# Altium footprint library laihi.PcbLib: 222 footprints (part 1 of 14)
Each footprint in its own frame and in the unit in brackets; x right, y up, seen from the top. Pads: shape width x height; smd on the part's side, far side on the other; paste and mask are expansions set on the pad; w line width, h text height; cw(c..) or ccw(c..) is an arc to the next point about the centre after c.
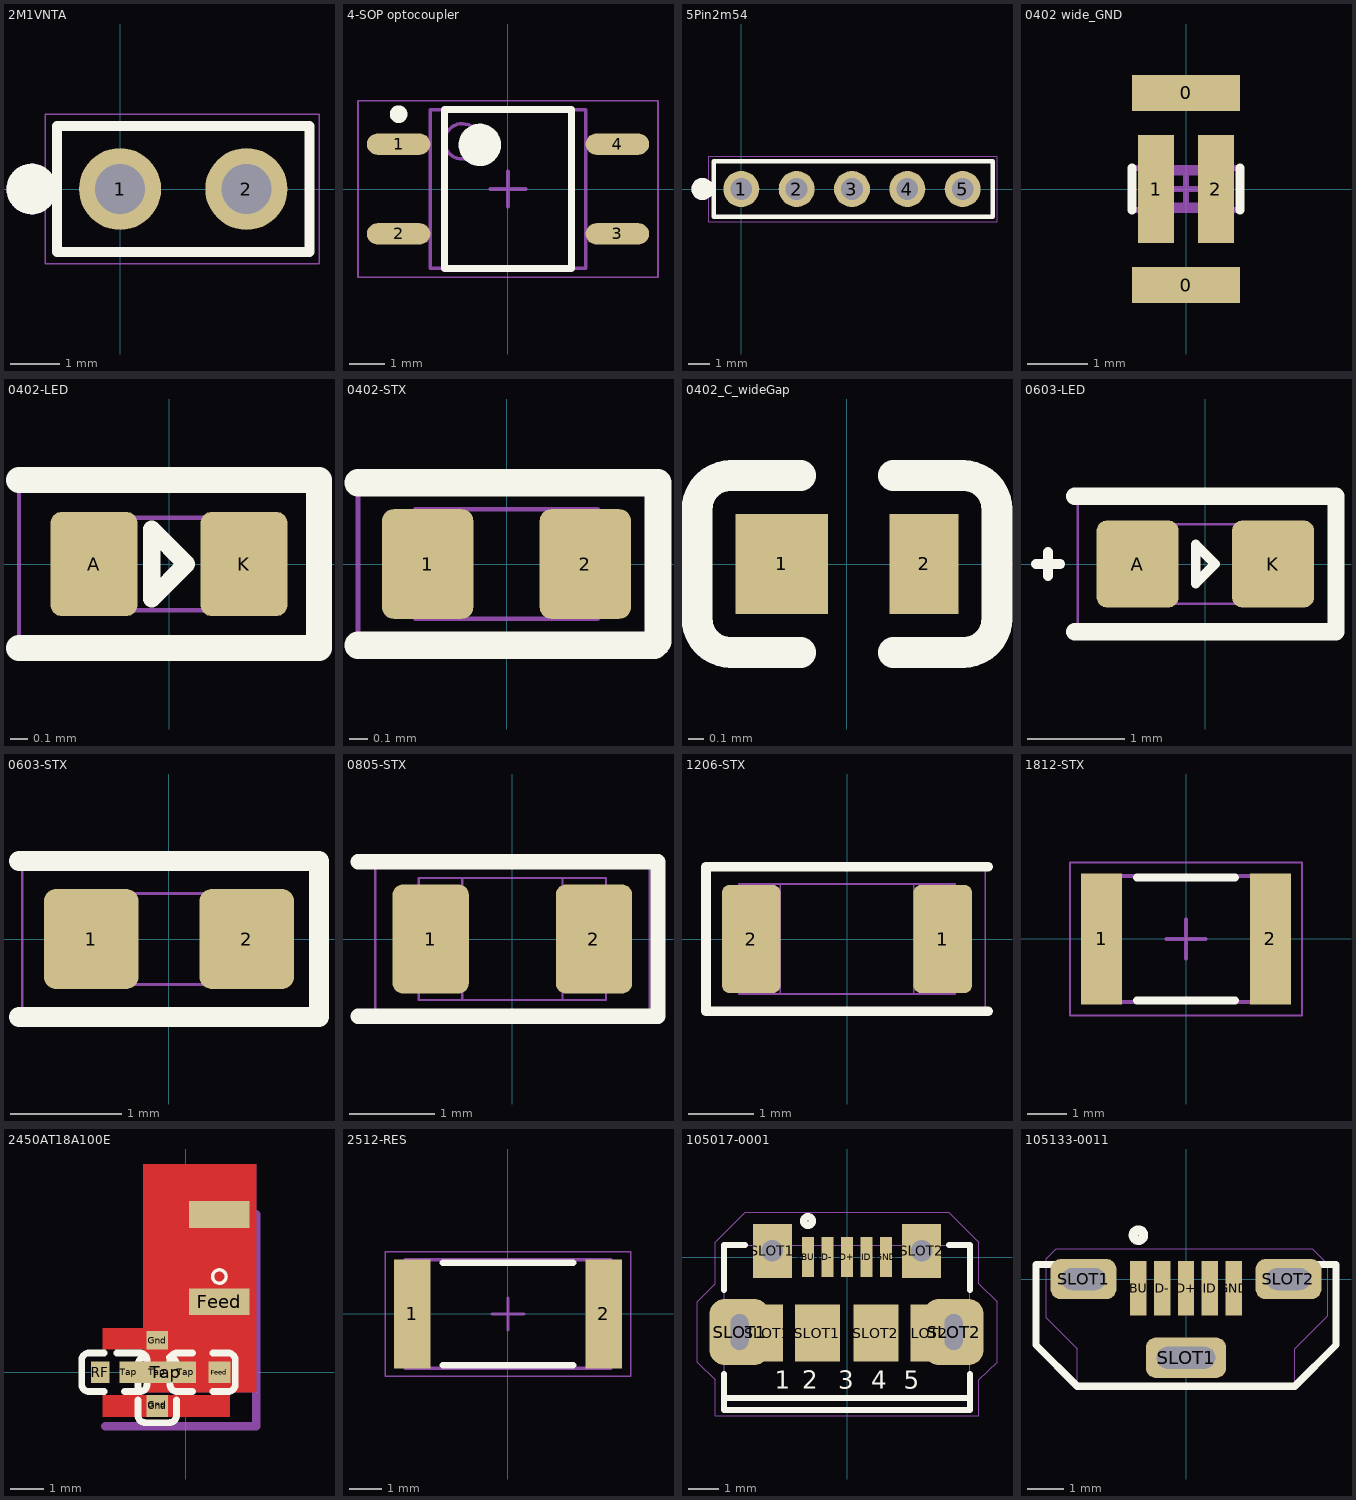
[diagram p0: the footprints below, top view; thin cyan lines are the x and y axes]

## 2M1VNTA [mil]
pads (2):
  round 65 / inner round 65 / far side rect 65x65 hole 39.37: 1(0,0)
  round 65 hole 39.37: 2(100,0)
Top Overlay:
  circle w20: c-70,0 r10
  lines w8: -50,-50 150,-50 150,50 -50,50 -50,-50
Mechanical 13:
  circle w20: c-70,0 r10
  circle w1: c0,0 r19.68
  circle w1: c100,0 r19.75
  lines w1: -50,-50 150,-50 150,50 -50,50 -50,-50 ; -10,-10 10,-10 10,10 -10,10 -10,-10 ; 90,-10 90,10 110,10 110,-10 90,-10
Mechanical 15:
  lines w1: -59.06,-59.06 -59.06,59.06 157.48,59.06 157.48,-59.06 -59.06,-59.06
3D body "header_male_2011GS_1x2pin_straight.stp": height 336.22, standoff -118.11, extent -50,-50 148.43,48.43

## 4-SOP optocoupler [mm] "NEC2711"
height 2.1
pads (4):
  oval 1.8x0.6 smd: 1(-3.1,1.27) 2(-3.1,-1.27) 3(3.1,-1.27) 4(3.1,1.27)
Top Overlay:
  circle w0.6: c-0.8,1.25 r0.3
  circle w0.25: c-3.1,2.12 r0.125
  lines w0.2: -1.8,-2.25 1.8,-2.25 1.8,2.25 -1.8,2.25 -1.8,-2.25
Mechanical 13:
  circle w0.1: c-1.3,1.35 r0.5
  lines w0.1: -2.2,-2.25 2.2,-2.25 2.2,2.25 -2.2,2.25 -2.2,-2.25
Mechanical 15:
  lines w0.05: -4.25,-2.5 4.25,-2.5 4.25,2.5 -4.25,2.5 -4.25,-2.5
  lines w0.1: -0.5,0 0.5,0 ; 0,-0.5 0,0.5
3D body "4-SOP optocoupler.step": height 2.1, standoff 0, extent -3.5,-2.25 3.5,2.25

## 5Pin2m54 [mil]
pads (5):
  round 65 / inner round 65 / far side rect 65x65 hole 39.37: 1(0,0)
  round 65 hole 39.37: 2(100,0) 3(200,0) 4(300,0) 5(400,0)
Top Overlay:
  circle w20: c-70,0 r10
  lines w8: -50,-50 454,-50 454,50 -50,50 -50,-50
Mechanical 13:
  circle w20: c-70,0 r10
  circle w1: c0,0 r19.68
  circle w1: c100,0 r19.75
  lines w1: -50,-50 454,-50 454,50 -50,50 -50,-50 ; -10,-10 10,-10 10,10 -10,10 -10,-10 ; 90,-10 90,10 110,10 110,-10 90,-10
Mechanical 15:
  lines w1: -59.06,-59.06 -59.06,59.06 462,59.06 462,-59.06 -59.06,-59.06

## 0402 wide_GND [mm] "Chip Capacitor, 2-Leads, Body 1.0x0.5mm, IPC High Density"
height 0.4
pads (4):
  rect 1.8x0.6 smd: 0(0,-1.6) 0(0,1.6)
  rect 0.6x1.8 smd: 1(-0.5,0) 2(0.5,0)
Top Overlay:
  lines w0.152: -0.9,-0.35 -0.9,0.35 ; 0.9,-0.35 0.9,0.35
Mechanical 13:
  lines w0.1: -0.525,-0.275 -0.525,0.275 0.525,0.275 0.525,-0.275 -0.525,-0.275
Mechanical 15:
  lines w0.1: -0.275,0 0.275,0 ; 0,-0.275 0,0.275 ; -0.9,-0.35 0.9,-0.35 0.9,0.35 -0.9,0.35 -0.9,-0.35
3D body "User Library-0402(1005M) Cap.step": height 0.5, standoff -0.01, extent -0.508,-0.254 0.508,0.254

## 0402-LED [mm]
height 0.406
pads (2):
  rrect25% 0.5x0.6 smd mask+0.127: A(-0.432,0) K(0.432,0)
Top Overlay:
  lines w0.102: -0.1,-0.2 0.1,0 -0.1,0.2 -0.1,-0.2
  lines w0.15: -0.864,-0.483 0.864,-0.483 0.864,0.483 -0.864,0.483
Mechanical 13:
  lines w0.025: -0.254,-0.267 -0.254,0.267 ; 0.254,-0.267 0.254,0.267 ; -0.533,-0.267 -0.533,0.267 0.546,0.267 0.546,-0.267 -0.533,-0.267
Mechanical 15:
  lines w0.025: -0.864,-0.483 -0.864,0.483 0.864,0.483 0.864,-0.483 -0.864,-0.483
3D body: height 0.56, standoff 0, extent -0.257,-0.282 0.258,0.284
3D body: height 0.55, standoff 0, extent -0.533,-0.267 0.546,0.267

## 0402-STX [mm]
height 0.406
pads (2):
  rrect25% 0.5x0.6 smd mask+0.051: 1(-0.432,0) 2(0.432,0)
Top Overlay:
  lines w0.15: -0.813,-0.445 0.809,-0.445 0.829,-0.424 0.829,0.445 -0.813,0.445
Mechanical 13:
  lines w0.025: -0.248,-0.3 -0.248,0.3 ; 0.26,-0.3 0.26,0.3 ; -0.5,-0.3 0.5,-0.3 0.5,0.3 -0.5,0.3 -0.5,-0.3
Mechanical 15:
  lines w0.025: -0.813,-0.445 0.813,-0.445 0.813,0.445 -0.813,0.445 -0.813,-0.445
3D body "0402-RES.stp": height 0.42, standoff 0, extent -0.5,-0.3 0.5,0.3

## 0402_C_wideGap [mm]
pads (2):
  rect 0.6x0.65 smd mask+0.051: 1(-0.425,0)
  rect 0.448x0.65 smd mask+0.051: 2(0.501,0)
Top Overlay:
  lines w0.2: -0.755,-0.575 cw(c-0.755,-0.355) -0.975,-0.355 -0.975,0.355 cw(c-0.755,0.355) -0.755,0.575 ; -0.75,-0.575 -0.3,-0.575 ; -0.75,0.575 -0.3,0.575 ; 0.3,-0.575 0.75,-0.575 ; 0.3,0.575 0.75,0.575 ; 0.755,-0.575 ccw(c0.755,-0.355) 0.975,-0.355 0.975,0.355 ccw(c0.755,0.355) 0.755,0.575
3D body "0402 SMD Capacitor.step": height 0.2, standoff 0, extent -0.483,-0.3 0.518,0.3

## 0603-LED [mm] "STX"
height 0.508
pads (2):
  rrect25% 0.85x0.9 smd mask+0.127: A(-0.7,0) K(0.7,0)
Top Overlay:
  lines w0.102: -1.75,0 -1.5,0 ; -1.625,-0.125 -1.625,0.125 ; -0.1,-0.2 -0.1,0.2 0.1,0 -0.1,-0.2
  lines w0.18: -1.35,-0.7 1.35,-0.7 1.35,0.7 -1.35,0.7
Mechanical 13:
  lines w0.025: -0.5,-0.41 -0.5,0.41 ; 0.5,-0.41 0.5,0.41 ; -0.85,-0.41 0.85,-0.41 0.85,0.41 -0.85,0.41 -0.85,-0.41
Mechanical 15:
  lines w0.025: -1.321,-0.648 -1.321,0.648 1.321,0.648 1.321,-0.648 -1.321,-0.648
3D body "0603-RES.stp": height 0.57, standoff 0, extent -0.9,-0.45 0.9,0.45

## 0603-STX [mm] "STX"
height 0.508
pads (2):
  rrect25% 0.85x0.9 smd mask+0.127: 1(-0.7,0) 2(0.7,0)
Top Overlay:
  lines w0.18: -1.35,-0.7 1.35,-0.7 1.35,0.7 -1.35,0.7
Mechanical 13:
  lines w0.025: -0.5,-0.41 -0.5,0.41 ; 0.5,-0.41 0.5,0.41 ; -0.85,-0.41 -0.85,0.41 0.85,0.41 0.85,-0.41 -0.85,-0.41
Mechanical 15:
  lines w0.025: -1.321,-0.648 1.321,-0.648 1.321,0.648 -1.321,0.648 -1.321,-0.648
3D body "0603-RES.stp": height 0.57, standoff 0, extent -0.9,-0.45 0.9,0.45

## 0805-STX [mil] "STX"
height 20
pads (2):
  rrect25% 35x50 smd mask+5: 1(-37.5,0) 2(37.5,0)
Top Overlay:
  lines w7.09: -70.9,-35.43 66.9,-35.43 66.9,35.43 -70.9,35.43
Mechanical 13:
  lines w1: -23,-28 -23,28 ; 23,-28 23,28 ; -43,-28 -43,28 43,28 43,-28 -43,-28
Mechanical 15:
  lines w0.98: -62.99,-33.46 -62.99,33.46 62.99,33.46 62.99,-33.46 -62.99,-33.46
3D body "0805-RES.stp": height 24.41, standoff 0, extent -43.3,-26.57 43.31,26.58

## 1206-STX [mil] "STX"
height 24.02
pads (2):
  rrect25% 35x65 smd mask+5: 1(57.48,0) 2(-57.48,0)
Top Overlay:
  lines w5.91: 84.65,-43.31 -84.65,-43.31 -84.65,43.31 84.65,43.31
Mechanical 13:
  lines w0.98: -65,-32.99 65,-32.99
  lines w1: -65,-33 -65,33 65,33 65,-33 ; -40,-33 -40,33 ; 40,-33 40,33
Mechanical 15:
  lines w1: -83,-43 -83,43 83,43 83,-43 -83,-43
3D body "1206-RES.stp": height 28.35, standoff 0, extent -66.93,-35.44 66.93,35.43

## 1812-STX [mm] "1812 (or 4532 metric)"
height 1.4
pads (2):
  rect 1.05x3.34 smd: 1(-2.15,0) 2(2.15,0)
Top Overlay:
  lines w0.2: -1.25,-1.57 1.25,-1.57 ; -1.25,1.57 1.25,1.57
Mechanical 13:
  lines w0.1: -2.25,-1.6 -2.25,1.6 2.25,1.6 2.25,-1.6 -2.25,-1.6
Mechanical 15:
  lines w0.05: -2.95,-1.95 -2.95,1.95 2.95,1.95 2.95,-1.95 -2.95,-1.95
  lines w0.1: -0.5,0 0.5,0 ; 0,-0.5 0,0.5
3D body: height 1.4, standoff 0, extent -1.74,-1.6 1.74,1.6
3D body: height 1.4, standoff 0, extent -2.25,-1.6 -1.74,1.6
3D body: height 1.4, standoff 0, extent 1.74,-1.6 2.25,1.6

## 2450AT18A100E [mm] "2.4GHz Mini Antenna,"
pads (12):
  rect 0.6x0.65 smd mask+0.051: Feed(1,0)
  rect 0.65x0.65 smd: Feed(1,0) Gnd(-0.85,-1)
  rect 1.8x0.8 smd mask+0.051: Feed(1,2.1) ""(1,4.7)
  rect 0.65x0.55 smd mask+0.051: Gnd(-0.85,-0.95) Gnd(-0.85,0.95) Tap(-0.85,0)
  rect 0.55x0.65 smd mask+0.051: RF(-2.55,0) Tap(-1.7,0)
  rect 1.8x0.65 smd: Tap(-0.6,0)
  rect 0.6x0.65 smd: Tap(0,0)
Top Layer:
  rectangle: -2.475,0.675 0.305,1.325
  rectangle: -2.475,-1.325 1.321,-0.675
  region: 1.325,2.4 0.675,2.4 0.675,-0.33 1.325,-0.33
  pour cut-out: 2.1,-0.6 -1.27,-0.6 -1.27,6.2 2.1,6.2
Bottom Layer:
  pour cut-out: 2.1,-0.6 -1.27,-0.6 -1.27,6.2 2.1,6.2
Top Overlay:
  circle w0.1: c1,2.85 r0.2
  lines w0.2: -2.88,-0.575 cw(c-2.88,-0.355) -3.1,-0.355 -3.1,0.355 cw(c-2.88,0.355) -2.88,0.575 ; -2.875,-0.575 -2.425,-0.575 ; -2.875,0.575 -2.425,0.575 ; -2.055,0.575 -1.345,0.575 ; -1.825,-0.575 -1.375,-0.575 ; -1.825,0.575 -1.375,0.575 ; -1.425,-1.28 ccw(c-1.205,-1.28) -1.205,-1.5 -0.495,-1.5 ccw(c-0.495,-1.28) -0.275,-1.28 ; -1.425,-1.275 -1.425,-0.825 ; -1.425,-0.455 -1.425,0.255 ; -1.425,-0.225 -1.425,0.225 ; -1.425,0.23 cw(c-1.205,0.23) -1.205,0.45 ; -1.37,-0.575 ccw(c-1.37,-0.355) -1.15,-0.355 -1.15,0.355 ccw(c-1.37,0.355) -1.37,0.575 ; -0.495,0.45 cw(c-0.495,0.23) -0.275,0.23 ; -0.275,-1.275 -0.275,-0.825 ; -0.275,-0.225 -0.275,0.225 ; -0.255,-0.575 cw(c-0.255,-0.355) -0.475,-0.355 -0.475,0.355 cw(c-0.255,0.355) -0.255,0.575 ; -0.25,-0.575 0.2,-0.575 ; -0.25,0.575 0.2,0.575 ; 0.8,-0.575 1.25,-0.575 ; 0.8,0.575 1.25,0.575 ; 1.255,-0.575 ccw(c1.255,-0.355) 1.475,-0.355 1.475,0.355 ccw(c1.255,0.355) 1.255,0.575
Top Solder:
  region: -1.803,1.422 -1.803,0.584 0.356,0.584 0.356,1.422
  region: -2.032,-0.584 -2.032,-1.422 1.422,-1.422 1.422,-0.584
  rectangle: 0.584,0.406 1.422,1.422
Mechanical 1:
  lines w0.254: -2.4,-1.6 2.1,-1.6 2.1,4.7
3D body "0402 SMD Capacitor.step": height 0.2, standoff 0, extent -0.018,-0.3 0.983,0.3
3D body "0402 SMD Capacitor.step": height 0.2, standoff 0, extent -2.608,-0.3 -1.607,0.3
3D body "0402 SMD Capacitor.step": height 0.2, standoff 0, extent -1.15,-1.008 -0.55,-0.007

## 2512-RES [mm] "Chip Resistor, 2-Leads, Body 6.35x3.20mm, IPC Medium Density"
height 0.55
pads (2):
  rect 1.15x3.4 smd: 1(-3,0) 2(3,0)
Top Overlay:
  lines w0.2: -2.05,-1.6 2.05,-1.6 ; -2.05,1.6 2.05,1.6
Mechanical 13:
  lines w0.1: -3.225,-1.7 3.225,-1.7 3.225,1.7 -3.225,1.7 -3.225,-1.7
Mechanical 15:
  lines w0.05: -3.85,-1.95 3.85,-1.95 3.85,1.95 -3.85,1.95 -3.85,-1.95
  lines w0.1: -0.5,0 0.5,0 ; 0,-0.5 0,0.5
3D body "2512-RES.step": height 0.55, standoff 0, extent -3.225,-1.7 3.225,1.7

## 105017-0001 [mm] "Micro USB Type-B Bottom-Mount"
height 2.94
pads (13):
  rect 0.4x1.35 smd: D+(0,0) D-(-0.65,0) GND(1.3,0) ID(0.65,0) VBUS(-1.3,0)
  rrect50% 2x2.2 hole 0.6 slot 1.2 at 90 deg: SLOT1(-3.581,-2.5) SLOT2(3.556,-2.5)
  rect 1x1.9 smd: SLOT1(-2.642,-2.54) SLOT2(2.616,-2.54)
  rect 1.3x1.8 hole 0.72: SLOT1(-2.49,0.203) SLOT2(2.49,0.203)
  rect 1.5x1.9 smd: SLOT1(-0.991,-2.54) SLOT2(0.965,-2.54)
Top Overlay:
  circle w0.25: c-1.3,1.2 r0.141
  lines w0.2: -4.1,-4.7 4,-4.7 ; -4.1,-3.9 -4.1,-5.1 4.1,-5.1 4.1,-3.9 ; -4.1,-1.1 -4.1,0.4 -3.4,0.4 ; 3.4,0.4 4.1,0.4 4.1,-1.1
  text "1" at -2.4,-4.4 h0.6
  text "5" at 1.9,-4.4 h0.6
  text "2" at -1.5,-4.4 h0.6
  text "3" at -0.3,-4.4 h0.6
  text "4" at 0.8,-4.4 h0.6
Mechanical 13:
  lines w0.025: -4.1,-4.7 4.1,-4.7 ; -4.1,-5.1 -4.1,0.4 4.1,0.4 4.1,-5.1 -4.1,-5.1
Mechanical 15:
  lines w0.025: -5,-3.5 -5,-1.5 -4.4,-0.9 -4.4,0.5 -3.4,1.5 3.4,1.5 4.4,0.5 4.4,-0.9 5,-1.5 5,-3.5 4.4,-4.1 4.4,-5.3 -4.4,-5.3 -4.4,-4.1 -5,-3.5
3D body "USB-uB_Bottom_Mount_RA_Molex_1050170001.stp": height 2.68, standoff -0.63, extent -4.111,-5.074 4.089,0.356

## 105133-0011 [mm] "Micro USB Type-B SMT vertical"
height 6.7
pads (8):
  rect 0.45x1.5 smd: D+(0,-0.25) D-(-0.65,-0.25) GND(1.3,-0.25) ID(0.65,-0.25) VBUS(-1.3,-0.25)
  rrect50% 1.8x1.1 hole 0.6 slot 1.2 at 0 deg: SLOT1(-2.8,0) SLOT2(2.8,0)
  rrect50% 2.2x1.1 hole 0.6 slot 1.6 at 0 deg: SLOT1(0,-2.15)
Top Overlay:
  circle w0.25: c-1.3,1.2 r0.141
  lines w0.2: -3.4,0.4 -4.1,0.4 -4.1,-1.1 -4.1,-1.8 -2.975,-2.925 2.975,-2.925 4.1,-1.8 4.1,-1.1 4.1,0.4 3.4,0.4
Mechanical 15:
  lines w0.025: 3.825,-1.05 2.975,-1.9 ; 2.975,-1.9 2.975,-2.925 -2.975,-2.925 -2.975,-2.675 -2.975,-1.9 -3.825,-1.05 -3.825,0.55 -3.55,0.825 3.45,0.825 3.875,0.4 3.875,-1 2.975,-1.9
3D body "1051330011.stp": height 7.43, standoff -2.37, extent -4.067,-3.311 3.958,1.139